# Altium footprint library SparkFun.PCBLIB: 674 footprints (part 44 of 44)
Each footprint in its own frame and in the unit in brackets; x right, y up, seen from the top. Pads: shape width x height; smd on the part's side, far side on the other; paste and mask are expansions set on the pad; w line width, h text height; cw(c..) or ccw(c..) is an arc to the next point about the centre after c.
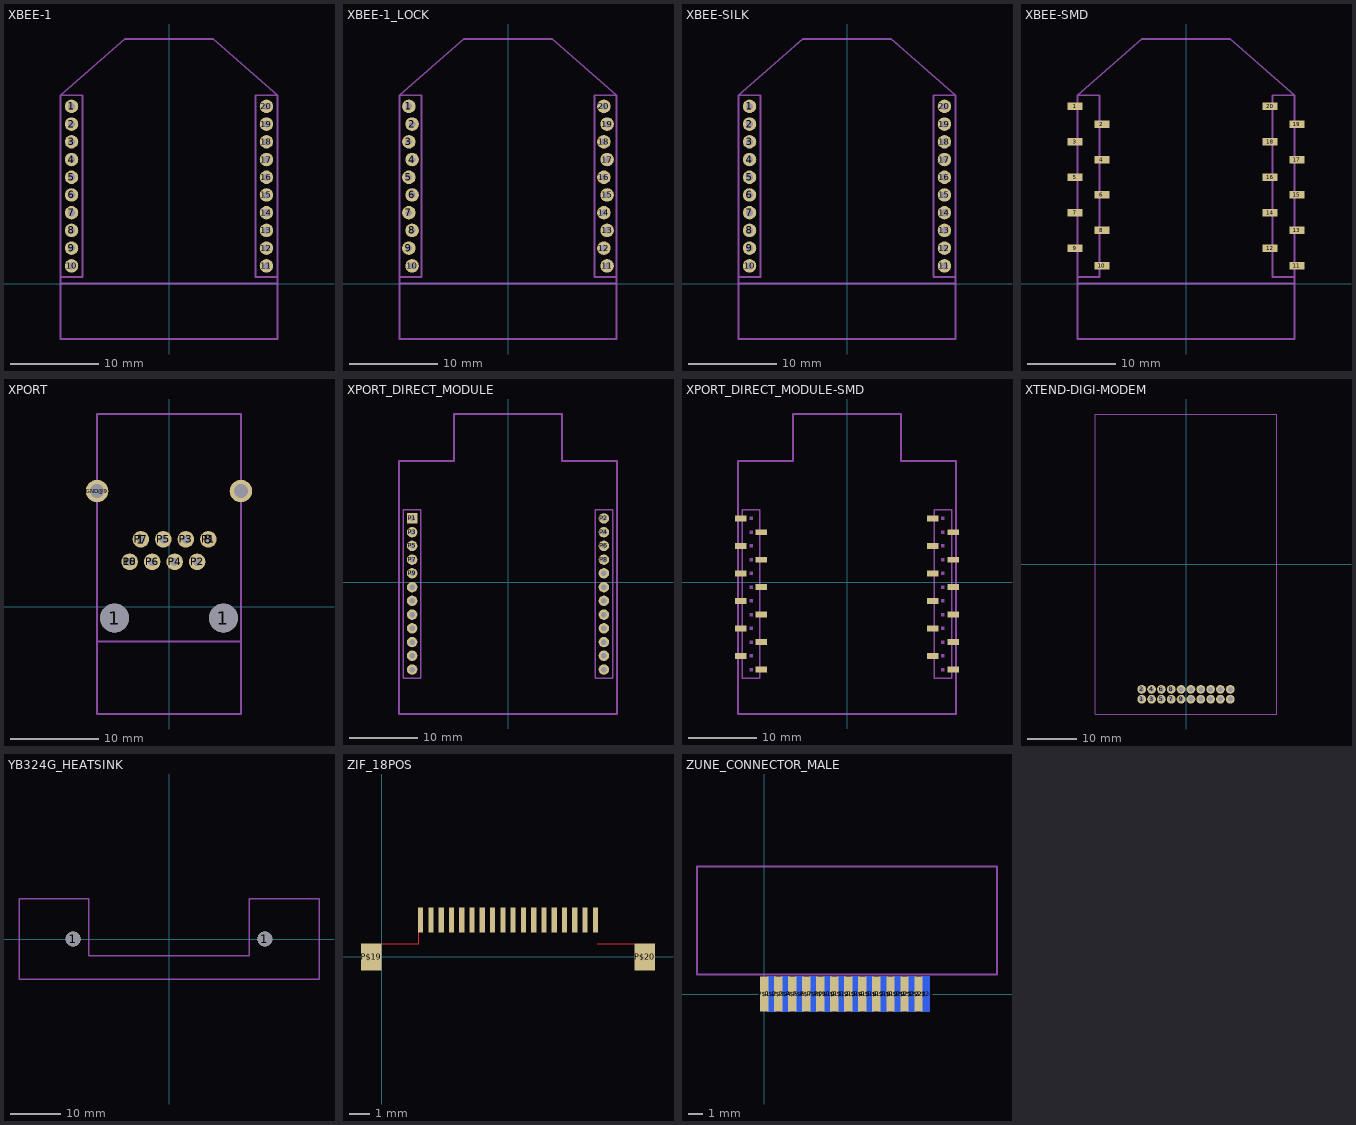
[diagram p43: the footprints below, top view; thin cyan lines are the x and y axes]

## XBEE-1 [mil]
pads (20):
  round 60 hole 31.5: 1(-433.07,787.4) 2(-433.07,708.66) 3(-433.07,629.92) 4(-433.07,551.18) 5(-433.07,472.44) 6(-433.07,393.7) 7(-433.07,314.96) 8(-433.07,236.22) 9(-433.07,157.48) 10(-433.07,78.74) 11(433.07,78.74) 12(433.07,157.48) 13(433.07,236.22) 14(433.07,314.96) 15(433.07,393.7) 16(433.07,472.44) 17(433.07,551.18) 18(433.07,629.92) 19(433.07,708.66) 20(433.07,787.4)
Mechanical 2:
  lines w8: -482.28,29.53 -482.28,836.61 -383.86,836.61 -383.86,29.53 -482.28,29.53 ; 383.86,29.53 482.28,29.53 482.28,836.61 383.86,836.61 383.86,29.53
Mechanical 18:
  lines w8: -482.28,29.53 -482.28,0 ; -482.28,836.61 -196.85,1086.61 196.85,1086.61 482.28,836.61 ; 482.28,29.53 482.28,0 ; -482.28,0 482.28,0 ; -482.28,0 -482.28,-246.06 482.28,-246.06 482.28,0

## XBEE-1_LOCK [mil]
pads (20):
  round 60 hole 29: 1(-440.07,787.4) 2(-426.07,708.66) 3(-440.07,629.92) 4(-426.07,551.18) 5(-440.07,472.44) 6(-426.07,393.7) 7(-440.07,314.96) 8(-426.07,236.22) 9(-440.07,157.48) 10(-426.07,78.74) 11(440.07,78.74) 12(426.07,157.48) 13(440.07,236.22) 14(426.07,314.96) 15(440.07,393.7) 16(426.07,472.44) 17(440.07,551.18) 18(426.07,629.92) 19(440.07,708.66) 20(426.07,787.4)
Mechanical 2:
  lines w8: -482.28,29.53 -482.28,836.61 -383.86,836.61 -383.86,29.53 -482.28,29.53 ; 383.86,29.53 482.28,29.53 482.28,836.61 383.86,836.61 383.86,29.53
Mechanical 18:
  rectangle: -437,68 -429,88
  rectangle: -437,147 -429,167
  rectangle: -437,225 -429,245
  rectangle: -437,304 -429,324
  rectangle: -437,383 -429,403
  rectangle: -437,463 -429,483
  rectangle: -437,541 -429,561
  rectangle: -437,619 -429,639
  rectangle: -437,698 -429,718
  rectangle: -437,777 -429,797
  rectangle: 429,68 437,88
  rectangle: 429,147 437,167
  rectangle: 429,225 437,245
  rectangle: 429,304 437,324
  rectangle: 429,383 437,403
  rectangle: 429,463 437,483
  rectangle: 429,541 437,561
  rectangle: 429,619 437,639
  rectangle: 429,698 437,718
  rectangle: 429,777 437,797
  lines w8: -482.28,29.53 -482.28,0 ; -482.28,836.61 -196.85,1086.61 196.85,1086.61 482.28,836.61 ; 482.28,29.53 482.28,0 ; -482.28,0 482.28,0 ; -482.28,0 -482.28,-246.06 482.28,-246.06 482.28,0

## XBEE-SILK [mil]
pads (20):
  round 60 hole 31.5: 1(-433.07,787.4) 2(-433.07,708.66) 3(-433.07,629.92) 4(-433.07,551.18) 5(-433.07,472.44) 6(-433.07,393.7) 7(-433.07,314.96) 8(-433.07,236.22) 9(-433.07,157.48) 10(-433.07,78.74) 11(433.07,78.74) 12(433.07,157.48) 13(433.07,236.22) 14(433.07,314.96) 15(433.07,393.7) 16(433.07,472.44) 17(433.07,551.18) 18(433.07,629.92) 19(433.07,708.66) 20(433.07,787.4)
Mechanical 2:
  lines w8: -224.41,1062.99 -196.85,1086.61 196.85,1086.61 224.41,1062.99 ; -482.28,29.53 -482.28,836.61 -383.86,836.61 -383.86,29.53 -482.28,29.53 ; -482.28,29.53 -482.28,0 482.28,0 482.28,29.53 ; 482.28,29.53 482.28,836.61 383.86,836.61 383.86,29.53 482.28,29.53
Mechanical 18:
  lines w8: -482.28,0 -482.28,-246.06 482.28,-246.06 482.28,0 ; -482.28,836.61 -196.85,1086.61 196.85,1086.61 482.28,836.61

## XBEE-SMD [mm]
pads (20):
  rect 1.7x0.85 smd: 1(-12.5,20) 2(-9.5,18) 3(-12.5,16) 4(-9.5,14) 5(-12.5,12) 6(-9.5,10) 7(-12.5,8) 8(-9.5,6) 9(-12.5,4) 10(-9.5,2) 11(12.5,2) 12(9.5,4) 13(12.5,6) 14(9.5,8) 15(12.5,10) 16(9.5,12) 17(12.5,14) 18(9.5,16) 19(12.5,18) 20(9.5,20)
Mechanical 2:
  lines w0.203: -12.25,1.3 -12.25,0.75 -9.75,0.75 -9.75,1.3 ; -12.25,20.6 -12.25,21.25 -9.75,21.25 -9.75,20.6 ; 9.75,1.3 9.75,0.75 12.25,0.75 12.25,1.3 ; 9.75,20.6 9.75,21.25 12.25,21.25 12.25,20.6
Mechanical 18:
  lines w0.203: -12.25,0 -12.25,0.75 ; -12.25,0 12.25,0 ; -12.25,0 -12.25,-6.25 12.25,-6.25 12.25,0 ; -12.25,0.75 -12.25,21.25 ; -12.25,0.75 -9.75,0.75 -9.75,21.25 -12.25,21.25 ; -12.25,21.25 -5,27.6 5,27.6 12.25,21.25 ; 12.25,0 12.25,0.75 ; 12.25,0.75 12.25,21.25 ; 12.25,0.75 9.75,0.75 9.75,21.25 12.25,21.25

## XPORT [mil]
pads (15):
  round 128 hole 128: 1(-242,-50) 1(242,-50)
  round 74 hole 35: 1(-125,300) 8(175,300) 10(-175,200) P1(175,300) P2(125,200) P3(75,300) P4(25,200) P5(-25,300) P6(-75,200) P7(-125,300) P8(-175,200)
  round 100 hole 62.99: GND@9(-320,515) GND@10(320,515)
Mechanical 2:
  lines w8: -320,-155 -320,858 320,858 320,-155 -320,-155
Mechanical 18:
  lines w8: -320,-155 -320,-477 320,-477 320,-155

## XPORT_DIRECT_MODULE [mil]
pads (24):
  rect 60x60 hole 31.5: P1(-550,366.14)
  round 60 hole 31.5: P2(550,366.14) P3(-550,287.4) P4(550,287.4) P5(-550,208.66) P6(550,208.66) P7(-550,129.92) P8(550,129.92) P9(-550,51.18) P10(550,51.18) P11(-550,-27.56) P12(550,-27.56) P13(-550,-106.3) P14(550,-106.3) P15(-550,-185.04) P16(550,-185.04) P17(-550,-263.78) P18(550,-263.78) P19(-550,-342.52) P20(550,-342.52) P21(-550,-421.26) P22(550,-421.26) P23(-550,-500) P24(550,-500)
Mechanical 2:
  lines w8: -599.21,-549.21 -599.21,415.35 -500.79,415.35 -500.79,-549.21 -599.21,-549.21 ; 500.79,-549.21 500.79,415.35 599.21,415.35 599.21,-549.21 500.79,-549.21
  lines w10: -625,450 -625,-755 -600,-755 ; 600,-755 625,-755 625,450
Mechanical 18:
  region: -540,-352.52 -540,-332.52 -560,-332.52 -560,-352.52
  region: -540,-431.26 -540,-411.26 -560,-411.26 -560,-431.26
  region: -540,-510 -540,-490 -560,-490 -560,-510
  region: -540,-273.78 -540,-253.78 -560,-253.78 -560,-273.78
  region: -540,-195.04 -540,-175.04 -560,-175.04 -560,-195.04
  region: -540,-116.3 -540,-96.3 -560,-96.3 -560,-116.3
  region: -540,-37.56 -540,-17.56 -560,-17.56 -560,-37.56
  region: -540,41.18 -540,61.18 -560,61.18 -560,41.18
  region: -540,119.92 -540,139.92 -560,139.92 -560,119.92
  region: -540,198.66 -540,218.66 -560,218.66 -560,198.66
  region: -540,277.4 -540,297.4 -560,297.4 -560,277.4
  region: -540,356.14 -540,376.14 -560,376.14 -560,356.14
  region: 560,-352.52 560,-332.52 540,-332.52 540,-352.52
  region: 560,-431.26 560,-411.26 540,-411.26 540,-431.26
  region: 560,-510 560,-490 540,-490 540,-510
  region: 560,-273.78 560,-253.78 540,-253.78 540,-273.78
  region: 560,-195.04 560,-175.04 540,-175.04 540,-195.04
  region: 560,-116.3 560,-96.3 540,-96.3 540,-116.3
  region: 560,-37.56 560,-17.56 540,-17.56 540,-37.56
  region: 560,41.18 560,61.18 540,61.18 540,41.18
  region: 560,119.92 560,139.92 540,139.92 540,119.92
  region: 560,198.66 560,218.66 540,218.66 540,198.66
  region: 560,277.4 560,297.4 540,297.4 540,277.4
  region: 560,356.14 560,376.14 540,376.14 540,356.14
  lines w10: -625,-755 625,-755 625,695 310,695 310,965 -310,965 -310,695 -625,695 -625,-755

## XPORT_DIRECT_MODULE-SMD [mil]
pads (24):
  rect 66.93x33.46 smd: P1(-609.13,365.9) P2(490.87,365.9) P3(-491.02,287.16) P4(608.98,287.16) P5(-609.13,208.4) P6(490.87,208.4) P7(-491.02,129.68) P8(608.98,129.68) P9(-609.13,50.92) P10(490.87,50.92) P11(-491.02,-27.82) P12(608.98,-27.82) P13(-609.13,-106.56) P14(490.87,-106.56) P15(-491.02,-185.3) P16(608.98,-185.3) P17(-609.13,-264.04) P18(490.87,-264.04) P19(-491.02,-342.78) P20(608.98,-342.78) P21(-609.13,-421.52) P22(490.87,-421.52) P23(-491.02,-500.26) P24(608.98,-500.26)
Mechanical 2:
  lines w8: -599.28,-527.82 -599.28,-549.47 -500.86,-549.47 -500.86,-527.82 ; -599.28,389.52 -599.28,415.11 -500.86,415.11 -500.86,389.52 ; 500.72,-527.82 500.72,-549.47 599.14,-549.47 599.14,-527.82 ; 500.72,389.52 500.72,415.11 599.14,415.11 599.14,389.52 ; -599.21,-549.21 -599.21,415.35 -500.79,415.35 -500.79,-549.21 -599.21,-549.21 ; 500.79,-549.21 500.79,415.35 599.21,415.35 599.21,-549.21 500.79,-549.21
  lines w10: -625,450 -625,-755 -600,-755 ; 600,-755 625,-755 625,450
Mechanical 18:
  region: -540,-352.52 -540,-332.52 -560,-332.52 -560,-352.52
  region: -540,-431.26 -540,-411.26 -560,-411.26 -560,-431.26
  region: -540,-510 -540,-490 -560,-490 -560,-510
  region: -540,-273.78 -540,-253.78 -560,-253.78 -560,-273.78
  region: -540,-195.04 -540,-175.04 -560,-175.04 -560,-195.04
  region: -540,-116.3 -540,-96.3 -560,-96.3 -560,-116.3
  region: -540,-37.56 -540,-17.56 -560,-17.56 -560,-37.56
  region: -540,41.18 -540,61.18 -560,61.18 -560,41.18
  region: -540,119.92 -540,139.92 -560,139.92 -560,119.92
  region: -540,198.66 -540,218.66 -560,218.66 -560,198.66
  region: -540,277.4 -540,297.4 -560,297.4 -560,277.4
  region: -540,356.14 -540,376.14 -560,376.14 -560,356.14
  region: 560,-352.52 560,-332.52 540,-332.52 540,-352.52
  region: 560,-431.26 560,-411.26 540,-411.26 540,-431.26
  region: 560,-510 560,-490 540,-490 540,-510
  region: 560,-273.78 560,-253.78 540,-253.78 540,-273.78
  region: 560,-195.04 560,-175.04 540,-175.04 540,-195.04
  region: 560,-116.3 560,-96.3 540,-96.3 540,-116.3
  region: 560,-37.56 560,-17.56 540,-17.56 540,-37.56
  region: 560,41.18 560,61.18 540,61.18 540,41.18
  region: 560,119.92 560,139.92 540,139.92 540,119.92
  region: 560,198.66 560,218.66 540,218.66 540,198.66
  region: 560,277.4 560,297.4 540,297.4 540,277.4
  region: 560,356.14 560,376.14 540,376.14 540,356.14
  lines w8: -599.28,-391.97 -599.28,415.11 -500.86,415.11 -500.86,-391.97 ; -599.28,257.61 -599.28,-549.47 -500.86,-549.47 -500.86,257.61 ; 500.72,-391.97 500.72,415.11 599.14,415.11 599.14,-391.97 ; 500.72,257.61 500.72,-549.47 599.14,-549.47 599.14,257.61
  lines w10: -625,-755 625,-755 625,695 310,695 310,965 -310,965 -310,695 -625,695 -625,-755

## XTEND-DIGI-MODEM [mil]
pads (20):
  round 70 hole 40: 1(-354.33,-1082.68) 2(-354.33,-1003.94) 3(-275.59,-1082.68) 4(-275.59,-1003.94) 5(-196.85,-1082.68) 6(-196.85,-1003.94) 7(-118.11,-1082.68) 8(-118.11,-1003.94) 9(-39.37,-1082.68) 10(-39.37,-1003.94) 11(39.37,-1082.68) 12(39.37,-1003.94) 13(118.11,-1082.68) 14(118.11,-1003.94) 15(196.85,-1082.68) 16(196.85,-1003.94) 17(275.59,-1082.68) 18(275.59,-1003.94) 19(354.33,-1082.68) 20(354.33,-1003.94)
Mechanical 18:
  lines w5: -728.35,-1200.79 -728.35,1200.79 728.35,1200.79 728.35,-1200.79 -728.35,-1200.79

## YB324G_HEATSINK [mil]
pads (2):
  round 118 hole 118: 1(-754,0) 1(754,0)
Mechanical 18:
  lines w10: -1181,-315 -1181,315 -630,315 -630,-130 630,-130 630,315 1181,315 1181,-315 -1181,-315

## ZIF_18POS [mm]
pads (20):
  rect 0.25x1.2 smd: P$1(1.9,1.8) P$2(2.4,1.8) P$3(2.9,1.8) P$4(3.4,1.8) P$5(3.9,1.8) P$6(4.4,1.8) P$7(4.9,1.8) P$8(5.4,1.8) P$9(5.9,1.8) P$10(6.4,1.8) P$11(6.9,1.8) P$12(7.4,1.8) P$13(7.9,1.8) P$14(8.4,1.8) P$15(8.9,1.8) P$16(9.4,1.8) P$17(9.9,1.8) P$18(10.4,1.8)
  rect 1x1.3 smd: P$19(-0.5,0) P$20(12.8,0)
Top Layer:
  lines w0: 0,0.65 1.8,0.65 1.8,1.2 ; 10.5,0.65 12.3,0.65

## ZUNE_CONNECTOR_MALE [mm]
pads (24):
  rect 0.6x2.5 smd: P$1(0,0) P$3(1,0) P$5(2,0) P$7(3,0) P$9(4,0) P$11(5,0) P$13(6,0) P$15(7,0) P$17(8,0) P$19(9,0) P$21(10,0) P$23(11,0)
  rect 0.6x2.5 smd far side: P$2(0.5,0) P$4(1.5,0) P$6(2.5,0) P$8(3.5,0) P$10(4.5,0) P$12(5.5,0) P$14(6.5,0) P$16(7.5,0) P$18(8.5,0) P$20(9.5,0) P$22(10.5,0) P$24(11.5,0)
Mechanical 18:
  lines w0.127: -4.8,1.4 16.6,1.4 16.6,9.1 -4.8,9.1 -4.8,1.5